# Altium footprint library 1MaxPcb.PcbLib: 187 footprints (part 11 of 12)
Each footprint in its own frame and in the unit in brackets; x right, y up, seen from the top. Pads: shape width x height; smd on the part's side, far side on the other; paste and mask are expansions set on the pad; w line width, h text height; cw(c..) or ccw(c..) is an arc to the next point about the centre after c.
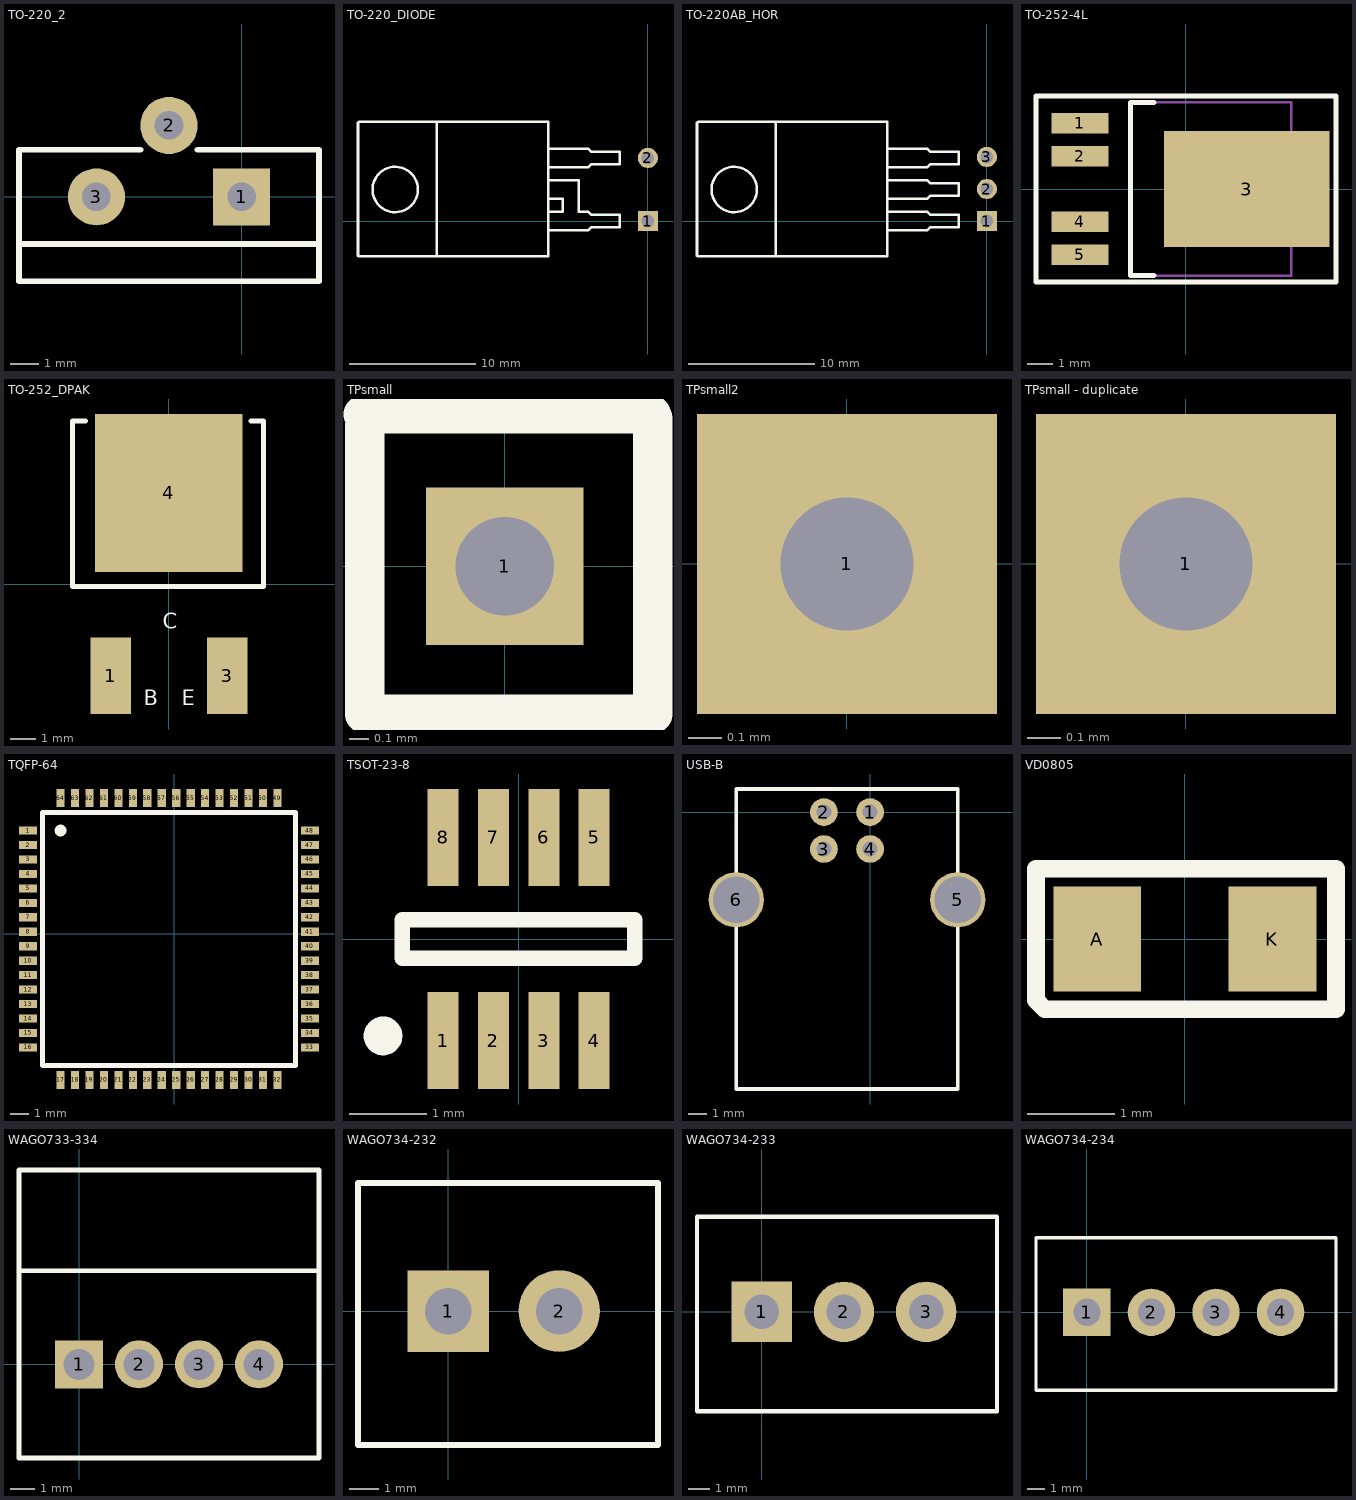
[diagram p10: the footprints below, top view; thin cyan lines are the x and y axes]

## TO-220_2 [mm]
height 20
pads (3):
  rect 2x2 hole 1: 1(0,0)
  round 2 hole 1: 2(-2.54,2.5) 3(-5.08,0)
Top Overlay:
  lines w0.2: -7.79,-1.65 2.71,-1.65 ; -3.54,1.65 -7.79,1.65 -7.79,-2.95 2.71,-2.95 2.71,1.65 -1.54,1.65

## TO-220_DIODE [mm]
pads (2):
  rect 1.6x1.6 hole 1: 1(0,0)
  round 1.6 hole 1: 2(0,5)
Top Overlay:
  circle w0.2: c-20.051,2.5 r1.8
  lines w0.2: -16.751,-2.81 -16.751,7.89 ; -7.901,-0.75 -4.75,-0.75 -4.5,-0.5 -2.25,-0.5 -2.25,0.5 -4.5,0.5 -4.75,0.75 -5.5,0.75 -5.5,3.25 -7.901,3.25 ; -7.901,0.75 -6.75,0.75 -6.75,1.75 -7.901,1.75 ; -7.901,4.25 -4.75,4.25 -4.5,4.5 -2.25,4.5 -2.25,5.5 -4.5,5.5 -4.75,5.75 -7.901,5.75 ; -23.001,-2.75 -22.941,-2.81 -7.901,-2.81 -7.901,7.89 -22.891,7.89 -23.001,7.78 -23.001,-2.75

## TO-220AB_HOR [mm]
pads (3):
  rect 1.6x1.6 hole 1: 1(0,0)
  round 1.6 hole 1: 2(0,2.54) 3(0,5.08)
Top Overlay:
  circle w0.2: c-20.051,2.5 r1.8
  lines w0.2: -16.751,-2.81 -16.751,7.89 ; -7.901,-0.75 -4.75,-0.75 -4.5,-0.5 -2.25,-0.5 -2.25,0.5 -4.5,0.5 -4.75,0.75 -7.901,0.75 ; -7.901,1.75 -4.75,1.75 -4.5,2 -2.25,2 -2.25,3 -4.5,3 -4.75,3.25 -7.901,3.25 ; -7.901,4.25 -4.75,4.25 -4.5,4.5 -2.25,4.5 -2.25,5.5 -4.5,5.5 -4.75,5.75 -7.901,5.75 ; -23.001,-2.75 -22.941,-2.81 -7.901,-2.81 -7.901,7.89 -22.891,7.89 -23.001,7.78 -23.001,-2.75

## TO-252-4L [mm] "D-PAK, 5-Pads, Body 6,21x6,72mm (max), IPC Medium Density"
height 2.4
pads (5):
  rect 2.2x0.8 smd: 1(-4.1,2.54) 2(-4.1,1.27) 4(-4.1,-1.27) 5(-4.1,-2.54)
  rect 6.4x4.5 smd: 3(2.35,0)
Top Overlay:
  lines w0.2: -1.25,-3.35 -2.15,-3.35 -2.15,3.35 -1.25,3.35 ; -5.8,-3.6 -5.8,3.6 5.8,3.6 5.8,-3.6 -5.8,-3.6
Mechanical 13:
  lines w0.1: -2.15,-3.35 -2.15,3.35 4.07,3.35 4.07,-3.35 -2.15,-3.35
Mechanical 15:
  lines w0.1: -0.5,0 0.5,0 ; 0,-0.5 0,0.5
3D body "TO252-4L.STEP": height 2.3, standoff -0.01, extent -4.84,-3.38 4.96,3.12

## TO-252_DPAK [mm] "Complementary PowerTransistors"
pads (3):
  rect 1.6x3 smd: 1(-2.285,-3.59) 3(2.285,-3.59)
  rect 5.8x6.2 smd: 4(-0.005,3.59)
Top Overlay:
  lines w0.2: -3.285,6.41 -3.785,6.41 -3.785,-0.09 3.715,-0.09 3.715,6.41 3.215,6.41
  text "C" at -0.246,-1.746 h0.6
  text "E" at 0.504,-4.746 h0.6
  text "B" at -0.996,-4.746 h0.6
3D body "User Library-DPAK_TO-252AA.STEP": height 2.37, standoff -0.03, extent -3.377,-4.063 3.357,6.037

## TPsmall [mm] "TPsmall"
height 9
pads (1):
  rect 0.8x0.8 hole 0.5: 1(0,0)
Top Overlay:
  lines w0.2: -0.719,0.773 0.743,0.773 ; -0.711,0.711 -0.711,-0.75 0.75,-0.75 0.75,0.75

## TPsmall2 [mm]
pads (1):
  rect 0.9x0.9 hole 0.4: 1(0,0)

## TPsmall - duplicate [mm]
pads (1):
  rect 0.9x0.9 hole 0.4: 1(0,0)

## TQFP-64 [mm]
pads (64):
  rect 1x0.45 smd: 1(-8.1,5.7) 2(-8.1,4.9) 3(-8.1,4.1) 4(-8.1,3.3) 5(-8.1,2.5) 6(-8.1,1.7) 7(-8.1,0.9) 8(-8.1,0.1) 9(-8.1,-0.7) 10(-8.1,-1.5) 11(-8.1,-2.3) 12(-8.1,-3.1) 13(-8.1,-3.9) 14(-8.1,-4.7) 15(-8.1,-5.5) 16(-8.1,-6.3) 33(7.5,-6.3) 34(7.5,-5.5) 35(7.5,-4.7) 36(7.5,-3.9) 37(7.5,-3.1) 38(7.5,-2.3) 39(7.5,-1.5) 40(7.5,-0.7) 41(7.5,0.1) 42(7.5,0.9) 43(7.5,1.7) 44(7.5,2.5) 45(7.5,3.3) 46(7.5,4.1) 47(7.5,4.9) 48(7.5,5.7)
  rect 0.45x1 smd: 17(-6.3,-8.1) 18(-5.5,-8.1) 19(-4.7,-8.1) 20(-3.9,-8.1) 21(-3.1,-8.1) 22(-2.3,-8.1) 23(-1.5,-8.1) 24(-0.7,-8.1) 25(0.1,-8.1) 26(0.9,-8.1) 27(1.7,-8.1) 28(2.5,-8.1) 29(3.3,-8.1) 30(4.1,-8.1) 31(4.9,-8.1) 32(5.7,-8.1) 49(5.7,7.5) 50(4.9,7.5) 51(4.1,7.5) 52(3.3,7.5) 53(2.5,7.5) 54(1.7,7.5) 55(0.9,7.5) 56(0.1,7.5) 57(-0.7,7.5) 58(-1.5,7.5) 59(-2.3,7.5) 60(-3.1,7.5) 61(-3.9,7.5) 62(-4.7,7.5) 63(-5.5,7.5) 64(-6.3,7.5)
Top Overlay:
  circle w0.254: c-6.3,5.7 r0.2
  lines w0.254: -6.3,5.5 -6.3,5.9 ; -7.3,-7.3 6.7,-7.3 6.7,6.7 -7.3,6.7 -7.3,-7.3
3D body "TQFP64.STEP": height 1.35, standoff -0.01, extent -8.424,-8.424 7.825,7.825

## TSOT-23-8 [mm]
pads (8):
  rect 0.4x1.25 smd mask+0.05: 1(-0.975,-1.31) 2(-0.325,-1.31) 3(0.325,-1.31) 4(0.975,-1.31) 5(0.975,1.31) 6(0.325,1.31) 7(-0.325,1.31) 8(-0.975,1.31)
Top Overlay:
  circle w0.25: c-1.75,-1.25 r0.125
  lines w0.2: -1.5,-0.25 1.5,-0.25 1.5,0.25 -1.5,0.25 -1.5,-0.25
3D body "User Library-TSOT-23-8.STEP": height 1, standoff 0, extent -1.45,-1.4 1.45,1.4

## USB-B [mm]
pads (6):
  round 1.5 hole 0.8: 1(0,0) 2(-2.5,0) 3(-2.5,-2) 4(0,-2)
  round 3 hole 2.5: 5(4.75,-4.75) 6(-7.25,-4.75)
Top Overlay:
  lines w0.2: -7.25,-15 -1.25,-15 4.75,-15 4.75,1.25 -7.25,1.25 -7.25,-15
3D body "WURTH_61400416121.STEP": height 10.9, standoff -3.32, extent -8.75,-15.015 6.2,1.485

## VD0805 [mm]
height 0.5
pads (2):
  rect 1x1.2 smd mask+0.03: A(-1,0) K(1,0)
Top Overlay:
  lines w0.2: -1.7,-0.7 -1.7,0.8 1.725,0.8 1.725,-0.8 -1.6,-0.8 -1.7,-0.7

## WAGO733-334 [mm] "(wago 733-364)"
pads (4):
  rect 2x2 hole 1.3: 1(0,0)
  round 2 hole 1.3: 2(2.5,0) 3(5,0) 4(7.5,0)
Top Overlay:
  lines w0.2: -2.5,3.9 10,3.9 ; -2.5,-3.9 10,-3.9 10,8.1 -2.5,8.1 -2.5,-3.9
3D body "733-334.stp": height 8.9, standoff -4.6, extent -2.5,-3.9 10,3.9

## WAGO734-232 [mm]
pads (2):
  rect 2.8x2.8 hole 1.6: 1(0,0)
  round 2.8 hole 1.6: 2(3.81,0)
Top Overlay:
  lines w0.2: -3.1,-4.6 7.2,-4.6 7.2,4.4 -3.1,4.4 -3.1,-4.6
3D body "WAGO 734-232.STEP": height 10.3, standoff -4.5, extent -2.8,-4.35 6.91,4.15

## WAGO734-233 [mm]
height 0.262
pads (3):
  rect 2.8x2.8 hole 1.6: 1(0,0)
  round 2.8 hole 1.6: 2(3.81,0) 3(7.62,0)
Top Overlay:
  lines w0.2: -3,-4.6 10.9,-4.6 10.9,4.4 -3,4.4 -3,-4.6
3D body "WAGO 734-233.STEP": height 10.3, standoff -4.5, extent -2.8,-4.35 10.72,4.15

## WAGO734-234 [mm]
pads (4):
  rect 2.8x2.8 hole 1.6: 1(0,0)
  round 2.8 hole 1.6: 2(3.81,0) 3(7.62,0) 4(11.43,0)
Top Overlay:
  lines w0.2: -3,-4.6 14.7,-4.6 14.7,4.4 -3,4.4 -3,-4.6
3D body "Wago 734-234.STEP": height 10.3, standoff -4.5, extent -2.8,-4.35 14.53,4.15